# Altium footprint library MyLib.PcbLib: 575 footprints (part 18 of 36)
Each footprint in its own frame and in the unit in brackets; x right, y up, seen from the top. Pads: shape width x height; smd on the part's side, far side on the other; paste and mask are expansions set on the pad; w line width, h text height; cw(c..) or ccw(c..) is an arc to the next point about the centre after c.
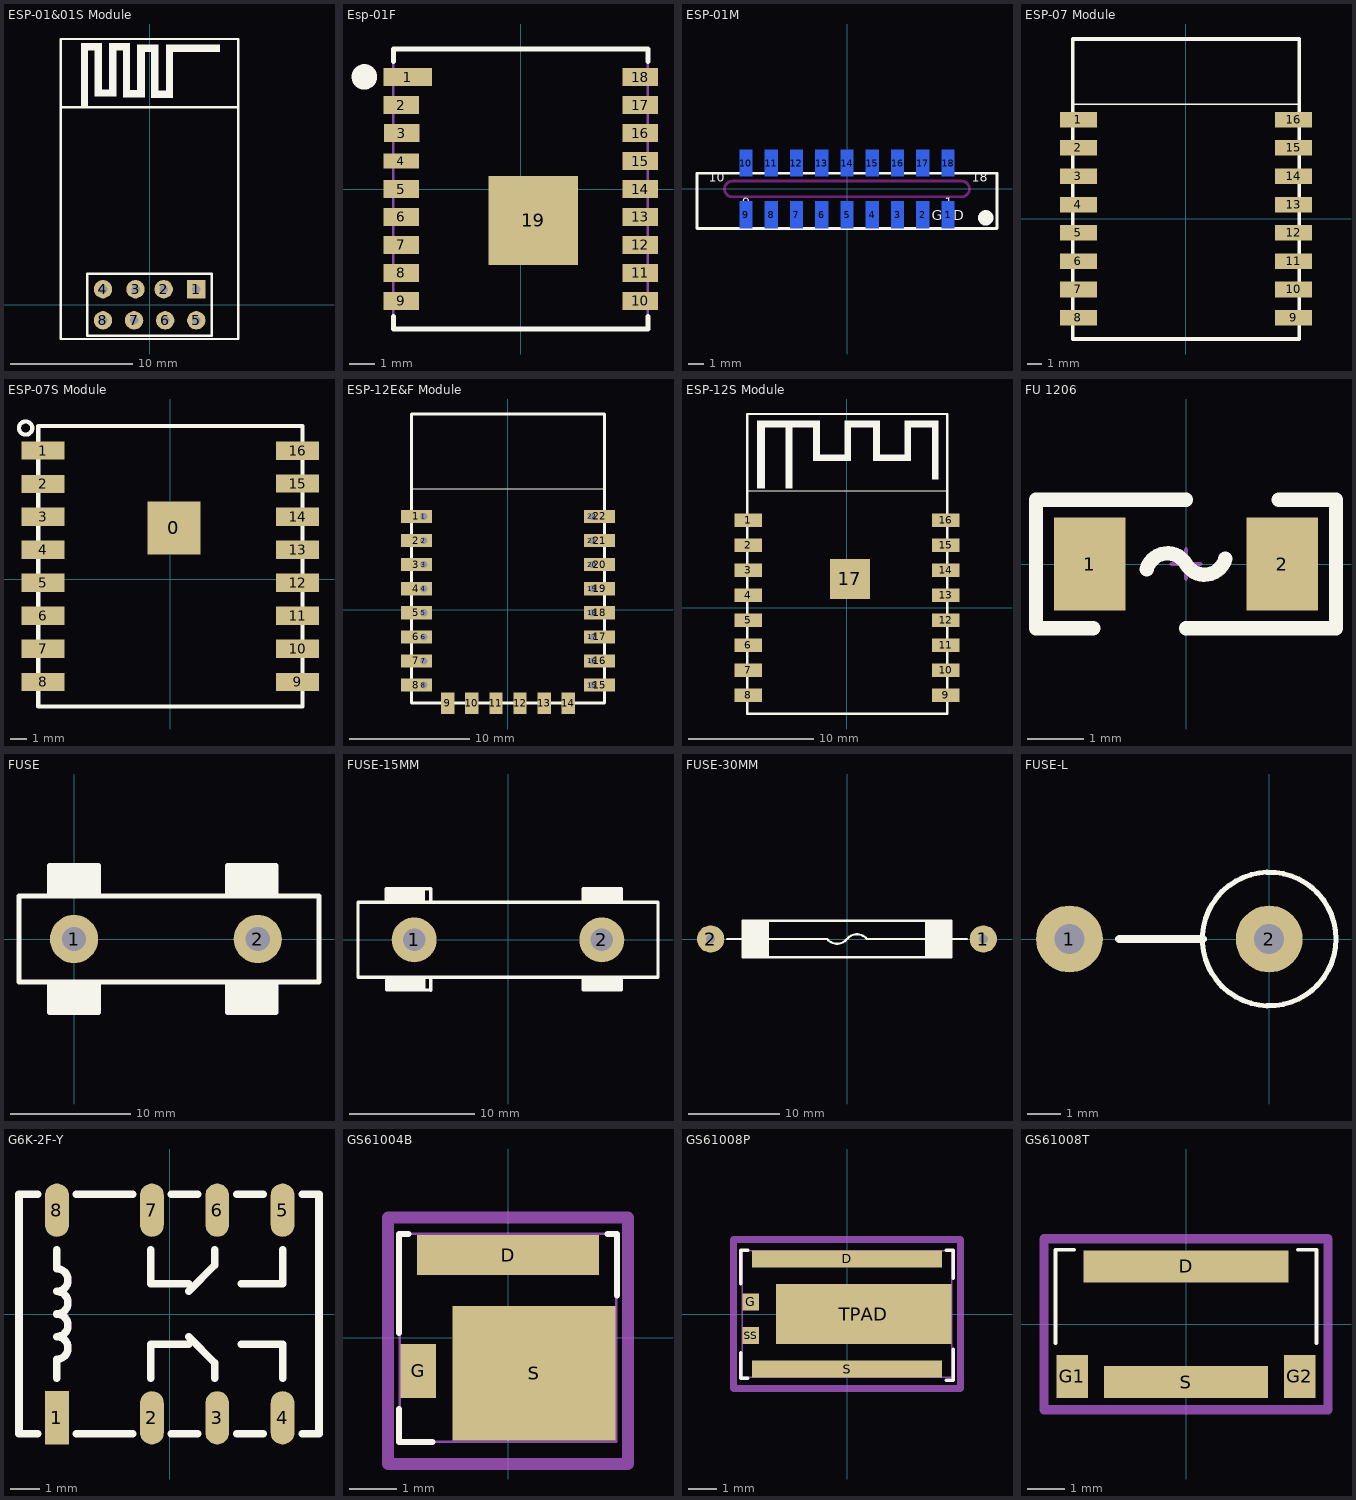
[diagram p17: the footprints below, top view; thin cyan lines are the x and y axes]

## ESP-01&01S Module [mm]
pads (8):
  rect 1.5x1.5 hole 0.7: 1(3.81,1.27)
  round 1.5 hole 0.7: 2(1.15,1.27) 3(-1.15,1.27) 4(-3.81,1.27) 5(3.81,-1.27) 6(1.27,-1.27) 7(-1.27,-1.27) 8(-3.81,-1.27)
Top Overlay:
  rectangle: 1.919,20.65 5.755,21.26
  rectangle: 1.335,17.501 1.919,21.26
  rectangle: 0.726,16.891 1.919,17.501
  rectangle: 0.116,16.891 0.726,20.65
  rectangle: -0.392,20.65 0.726,21.26
  rectangle: -1.027,17.526 -0.392,21.26
  rectangle: -1.586,16.942 -0.392,17.526
  rectangle: -2.17,16.942 -1.586,20.777
  rectangle: -2.703,20.777 -1.586,21.361
  rectangle: -3.313,17.602 -2.703,21.361
  rectangle: -3.897,17.018 -2.703,17.602
  rectangle: -4.507,17.018 -3.897,20.777
  rectangle: -5.015,20.777 -3.897,21.361
  rectangle: -5.599,16.129 -5.015,21.361
  lines w0.2: -7.25,16.129 7.25,16.129 ; -7.25,-2.794 -7.25,21.706 7.25,21.706 7.25,-2.794 -7.25,-2.794 ; -5.08,-2.54 5.08,-2.54 5.08,2.54 -5.08,2.54 -5.08,-2.54
3D body "HDR2.54-1x2P.STEP": height 8.5, standoff -3, extent -5.08,-2.54 -2.54,2.54
3D body "HDR2.54-1x2P.STEP": height 8.5, standoff -3, extent -2.54,-2.54 0,2.54
3D body "HDR2.54-1x2P.STEP": height 8.5, standoff -3, extent -0.127,-2.54 2.413,2.54
3D body "HDR2.54-1x2P.STEP": height 8.5, standoff -3, extent 2.413,-2.54 4.953,2.54

## Esp-01F [mm]
pads (19):
  rect 1.9x0.7 smd: 1(-4.441,4.4)
  rect 1.4x0.7 smd: 2(-4.695,3.3) 3(-4.67,2.2) 5(-4.695,0) 6(-4.695,-1.1) 7(-4.695,-2.2) 8(-4.695,-3.3) 9(-4.695,-4.4) 10(4.695,-4.4) 11(4.695,-3.3) 12(4.695,-2.2) 13(4.695,-1.1) 14(4.695,0) 15(4.695,1.1) 16(4.695,2.2) 17(4.695,3.3) 18(4.695,4.4)
  rect 1.4x0.6 smd: 4(-4.695,1.1)
  rect 3.5x3.5 smd: 19(0.493,-1.233)
Top Overlay:
  circle w0.5: c-6.143,4.406 r0.25
  lines w0.2: -5,-5.008 -5,-5.5 5,-5.5 5,-5.008 ; -5,5.008 -5,5.5 5,5.5 5,5.008
Mechanical 15:
  lines w0.1: -5,-5.5 -5,5.5 5,5.5 5,-5.5 -5,-5.5

## ESP-01M [mm]
pads (18):
  rect 0.8x1.7 smd far side: 1(6.4,-1.643) 2(4.8,-1.643) 3(3.2,-1.643) 4(1.6,-1.643) 5(0,-1.643) 6(-1.6,-1.643) 7(-3.2,-1.643) 8(-4.8,-1.643) 9(-6.4,-1.643) 10(-6.4,1.643) 11(-4.8,1.643) 12(-3.2,1.643) 13(-1.6,1.643) 14(0,1.643) 15(1.6,1.643) 16(3.2,1.643) 17(4.8,1.643) 18(6.4,1.643)
Top Overlay:
  circle w0.5: c8.788,-1.829 r0.234
  lines w0.178: -9.5,-2.5 9.5,-2.5 9.5,1 -9.5,1 -9.5,-2.5
  text "GND" at 5.359,-2.21 h1.1
  text "1" at 6.198,-1.346 h1
  text "9" at -6.629,-1.346 h1
  text "10" at -8.763,0.229 h1
  text "18" at 7.899,0.229 h1
Keep-Out Layer:
  lines w0.178: -7.75,-0.008 ccw(c-7.254,-0.004) -7.25,-0.5 7.25,-0.5 ccw(c7.254,-0.004) 7.75,-0.008 ; -7.75,0.008 cw(c-7.254,0.004) -7.25,0.5 7.25,0.5 cw(c7.254,0.004) 7.75,0.008

## ESP-07 Module [mm]
pads (16):
  rect 2.6x1.1 smd: 1(-7.6,7) 2(-7.6,5) 3(-7.6,3) 4(-7.6,1) 5(-7.6,-1) 6(-7.6,-3) 7(-7.6,-5) 8(-7.6,-7) 9(7.6,-7) 10(7.6,-5) 11(7.6,-3) 12(7.6,-1) 13(7.6,1) 14(7.6,3) 15(7.6,5) 16(7.6,7)
Top Overlay:
  lines w0.1: -8,8.1 8,8.1
  lines w0.254: -8,-8.5 8,-8.5 8,12.7 -8,12.7 -8,-8.5

## ESP-07S Module [mm]
pads (17):
  rect 3.2x3.2 smd: 0(0.22,3.092)
  rect 2.6x1.1 smd: 1(-7.7,7.775) 2(-7.7,5.762) 3(-7.7,3.775) 4(-7.7,1.775) 5(-7.7,-0.225) 6(-7.7,-2.225) 7(-7.7,-4.225) 8(-7.7,-6.225) 9(7.7,-6.225) 10(7.7,-4.225) 11(7.7,-2.225) 12(7.7,-0.225) 13(7.7,1.775) 14(7.7,3.775) 15(7.7,5.775) 16(7.7,7.769)
Top Overlay:
  circle w0.254: c-8.763,9.144 r0.402
  lines w0.254: -8,-7.725 -8,9.275 8,9.275 8,-7.725 -8,-7.725

## ESP-12E&F Module [mm]
pads (38):
  rect 2.6x1.1 smd: 1(-7.6,7.75) 2(-7.6,5.75) 3(-7.6,3.75) 4(-7.6,1.75) 5(-7.6,-0.25) 6(-7.6,-2.25) 7(-7.6,-4.25) 8(-7.6,-6.25) 15(7.6,-6.25) 16(7.6,-4.25) 17(7.6,-2.25) 18(7.6,-0.25) 19(7.6,1.75) 20(7.6,3.75) 21(7.6,5.75) 22(7.6,7.75)
  rect 0.762x1 hole 0.6: 1(-7,7.75) 7(-7,-4.25)
  rect 0.762x1 / inner rect 0.762x1 / far side rect 1x1 hole 0.6: 2(-7,5.75) 3(-7,3.75) 4(-7,1.75) 5(-7,-0.25) 6(-7,-2.25) 8(-7,-6.25) 15(7,-6.25) 16(7,-4.25) 17(7,-2.25) 18(7,-0.25) 19(7,1.75) 20(7,3.75) 21(7,5.75) 22(7,7.75)
  rect 1.1x1.8 smd: 9(-5,-7.75) 10(-3,-7.75) 11(-1,-7.75) 12(1,-7.75) 13(3,-7.75) 14(5,-7.75)
Top Overlay:
  lines w0.1: -8,10.05 8,10.05
  lines w0.254: -8,-7.75 -8,16.25 8,16.25 8,-7.75 -8,-7.75

## ESP-12S Module [mm]
pads (17):
  rect 2.2x1.1 smd: 1(-7.9,7) 2(-7.9,5) 3(-7.9,3) 4(-7.9,1) 5(-7.9,-1) 6(-7.9,-3) 7(-7.9,-5) 8(-7.9,-7) 9(7.9,-7) 10(7.9,-5) 11(7.9,-3) 12(7.9,-1) 13(7.9,1) 14(7.9,3) 15(7.9,5) 16(7.9,7)
  rect 3.2x3.2 smd: 17(0.22,2.321)
Top Overlay:
  region: -7.196,14.716 -7.196,9.563 -6.569,9.563 -6.569,14.716
  region: -7.196,14.463 -7.196,14.963 -2.196,14.963 -2.196,12.263 -0.196,12.263 -0.196,14.963 2.604,14.963 2.604,12.263 4.604,12.263 4.604,14.963 7.304,14.963 7.304,10.29 6.804,10.29 6.804,14.463 5.104,14.463 5.104,11.763 2.104,11.763 2.104,14.463 0.304,14.463 0.304,11.763 -2.696,11.763 -2.696,14.463 -4.396,14.463 -4.396,9.563 -4.896,9.563 -4.896,14.463
  lines w0.1: -8,9.354 8,9.354
  lines w0.2: -8,-8.496 -8,15.504 8,15.504 8,-8.496 -8,-8.496

## FU 1206 [mil] "贴片保险丝"
pads (2):
  rect 50x65 smd: 1(-67.5,0) 2(67.5,0)
Top Overlay:
  lines w10: -90,45 0,45 ; -65,-45 -105,-45 -105,45 -65,45 ; -27.48,-3.62 cw(c-12.99,-7.5) 0,0 ccw(c12.99,7.5) 27.48,3.62 ; 0,-45 90,-45 ; 65,-45 105,-45 105,45 65,45
Mechanical 15:
  lines w3: -10,0 10,0 ; 0,-10 0,10
3D body "FU 01206.STEP": height 34.25, standoff 0, extent -62.99,-31.89 62.99,31.89

## FUSE [mm]
pads (2):
  round 4 hole 2: 1(0,0) 2(15.24,0)
Top Overlay:
  rectangle: 12.7,-6.096 16.764,-3.556
  rectangle: -2.032,-6.096 2.032,-3.556
  rectangle: 12.7,3.556 16.764,6.096
  rectangle: -2.032,3.556 2.032,6.096
  lines w0.4: -2.032,-3.556 -2.032,-6.096 2.032,-6.096 2.032,-3.556 ; -2.032,3.556 -2.032,6.096 2.032,6.096 2.032,3.556 ; 12.7,-3.556 12.7,-6.096 16.764,-6.096 16.764,-3.556 ; 12.7,3.556 12.7,6.096 16.764,6.096 16.764,4.064 16.764,3.556 ; -4.572,-3.556 20.32,-3.556 20.32,3.556 -4.572,3.556 -4.572,2.54 -4.572,-2.54 -4.572,-3.556
3D body "SW3dPS-ZHL30.STEP": height 10.5, standoff -2.87, extent -4.301,-4.674 20.099,4.726
3D body "SW3dPS-Fuse Small 1A.STEP": height 8.55, standoff 3.45, extent -2.152,-2.311 17.548,2.789

## FUSE-15MM [mm]
height 6
pads (2):
  round 3.6 hole 1.8: 1(-7.5,0) 2(7.5,0)
Top Overlay:
  rectangle: 6.006,3.048 9.054,4.077
  rectangle: 6.069,-4.013 9.117,-2.984
  rectangle: -9.679,3.137 -6.631,4.166
  rectangle: -9.666,-3.94 -6.618,-2.911
  lines w0.254: -9.742,3.061 -9.742,4.077 -6.186,4.077 -6.186,3.061 ; -9.728,-3 -9.728,-4.016 -6.172,-4.016 ; -6.186,-4.039 -6.186,-3.023 ; 6.006,-2.997 6.006,-4.013 9.054,-4.013 ; 6.006,3.048 6.006,4.077 9.054,4.077 9.054,3.048 ; 9.054,-4.026 9.054,-3.023 ; -12,-3 12,-3 12,3 -12,3 -12,-3
3D body "SW3dPS-Fuse Small 1A.STEP": height 8.55, standoff 3.45, extent -9.373,-2.489 10.327,2.611
3D body "SW3dPS-ZHL30.STEP": height 10.5, standoff -2.87, extent -12.251,-4.75 12.149,4.65

## FUSE-30MM [mm]
height 10
pads (2):
  round 3 hole 1: 1(15,0) 2(-15,0)
Top Overlay:
  rectangle: -11.5,-2.025 -8.579,2
  region: 11.5,2 8.579,2 8.579,-2.025 11.5,-2.025
  lines w0.254: -13.208,0 -11.684,0 ; -11.176,0 -2.179,0 ; -2.179,-0.007 ccw(c-1.092,0.889) 0,0 cw(c1.092,-0.889) 2.179,0.007 ; 2.179,0 3.607,0 ; 3.529,0.004 10.668,0 ; 11.684,0 13.208,0 ; -11.5,-2 -11.5,2 11.5,2 11.5,-2 -11.5,-2
3D body "User Library-FUSIVEL.STEP": height 5, standoff 0, extent -10.262,-2.515 9.738,2.485

## FUSE-L [mil]
height 511.81
pads (2):
  round 79 hole 35.43: 1(-236.22,0) 2(0,0)
Top Overlay:
  circle w6: c0,0 r79
  lines w10: -177.17,0 -78.74,0
3D body "保": height 545.04, standoff -77.66, extent -249.02,-74.21 77.68,83.27

## G6K-2F-Y [mm] "10mm*6.5mm*5.2mm( 长*宽*高)"
pads (8):
  rect 0.8x1.8 smd: 1(-3.8,-3.5)
  oval 0.8x1.8 smd: 2(-0.6,-3.5) 3(1.6,-3.5) 4(3.8,-3.5) 5(3.8,3.5) 6(1.6,3.5) 7(-0.6,3.5) 8(-3.8,3.5)
Top Overlay:
  lines w0.254: -4.445,-4.039 -5.08,-4.039 -5.08,4.039 -4.445,4.039 ; -3.81,-2.159 -3.81,-1.524 ccw(c-3.81,-1.143) -3.81,-0.762 ccw(c-3.81,-0.381) -3.81,0 ccw(c-3.81,0.381) -3.81,0.762 ccw(c-3.81,1.143) -3.81,1.524 -3.81,2.159 ; -3.15,-4.039 -1.245,-4.039 ; -3.15,4.039 -1.245,4.039 ; -0.635,-2.159 -0.635,-1.016 0.635,-1.016 ; -0.635,2.159 -0.635,1.016 0.635,1.016 ; 0.051,-4.039 0.94,-4.039 ; 0.051,4.039 0.94,4.039 ; 0.635,-0.762 1.524,-1.651 1.524,-2.159 ; 0.635,0.762 1.524,1.651 1.524,2.159 ; 2.261,-4.039 3.15,-4.039 ; 2.261,4.039 3.15,4.039 ; 2.413,-1.016 3.81,-1.016 3.81,-2.159 ; 2.413,1.016 3.81,1.016 3.81,2.159 ; 4.47,-4.039 5.029,-4.039 5.029,4.039 4.47,4.039
3D body "G6K-2F-Y-.STEP": height 5.45, standoff -0.05, extent -4.953,-3.9 5.047,3.9

## GS61004B [mm] "GAN TRANS E-MODE 100V 45A"
height 0.45
pads (3):
  rect 3.85x0.85 smd: D(0,1.75)
  rect 0.75x1.15 smd: G(-1.9,-0.7)
  rect 3.45x2.85 smd: S(0.55,-0.75)
Top Overlay:
  lines w0.127: -2.3,-1.5 -2.3,-2.2 -1.6,-2.2 ; -2.3,0.1 -2.3,2.2 -2.1,2.2 ; 2.1,2.2 2.3,2.2 2.3,0.9
Mechanical 1:
  lines w0.05: -2.286,-2.2 2.286,-2.2 2.286,2.2 -2.286,2.2 -2.286,-2.2
Mechanical 5:
  lines w0.254: -2.54,-2.667 -2.54,2.54 2.54,2.54 2.54,-2.667 -2.54,-2.667
  text ".Designator" at -2.159,-0.635 h1.5
3D body: height 0.5, standoff 0, extent -2.286,-2.222 2.286,2.223

## GS61008P [mm] "GAN TRANS E-MODE 100V 90A"
height 0.45
pads (5):
  rect 6.8x0.6 smd: D(0,1.97) S(0,-1.97)
  rect 0.6x0.6 smd: G(-3.45,0.43) SS(-3.45,-0.77)
  rect 6.3x2.14 smd: TPAD(0.6,0)
Top Overlay:
  lines w0.127: -3.81,-1.397 -3.81,-2.297 -3.556,-2.297 ; -3.81,1.086 -3.81,2.286 -3.556,2.286 ; 3.556,-2.37 3.81,-2.37 3.81,-1.27 ; 3.556,2.286 3.81,2.286 3.81,1.286
Mechanical 1:
  lines w0.05: -3.75,-2.27 -3.75,2.27 3.75,2.27 3.75,-2.27 -3.75,-2.27
Mechanical 5:
  lines w0.254: -4.064,-2.667 4.064,-2.667 4.064,2.667 -4.064,2.667 -4.064,-2.667
  text ".Designator" at -3.048,-0.508 h2.54
3D body: height 0.5, standoff 0, extent -3.75,-2.27 3.75,2.27

## GS61008T [mm] "GAN TRANS EMODE 100V 90A TOP SIDE COOLED"
height 0.5
pads (4):
  rect 5.5x0.85 smd paste-0.1: D(0,1.55)
  rect 0.85x1.15 smd paste-0.1: G1(-3.05,-1.4)
  rect 0.85x1.15 smd: G2(3.05,-1.4)
  rect 4.4x0.85 smd paste-0.1: S(0,-1.55)
Top Overlay:
  lines w0.102: -3.5,-0.5 -3.5,2 -3,2 ; 3,2 3.5,2 3.5,-0.5
Mechanical 5:
  lines w0.254: -3.81,-2.3 3.81,-2.3 3.81,2.3 -3.81,2.3 -3.81,-2.3
  text ".Designator" at -3.048,-0.254 h2.54
3D body: height 0.5, standoff 0, extent -3.5,-2 3.5,2